# Altium footprint library Jetson-Nano-Baseboard.PcbLib: 60 footprints (part 2 of 4)
Each footprint in its own frame and in the unit in brackets; x right, y up, seen from the top. Pads: shape width x height; smd on the part's side, far side on the other; paste and mask are expansions set on the pad; w line width, h text height; cw(c..) or ccw(c..) is an arc to the next point about the centre after c.
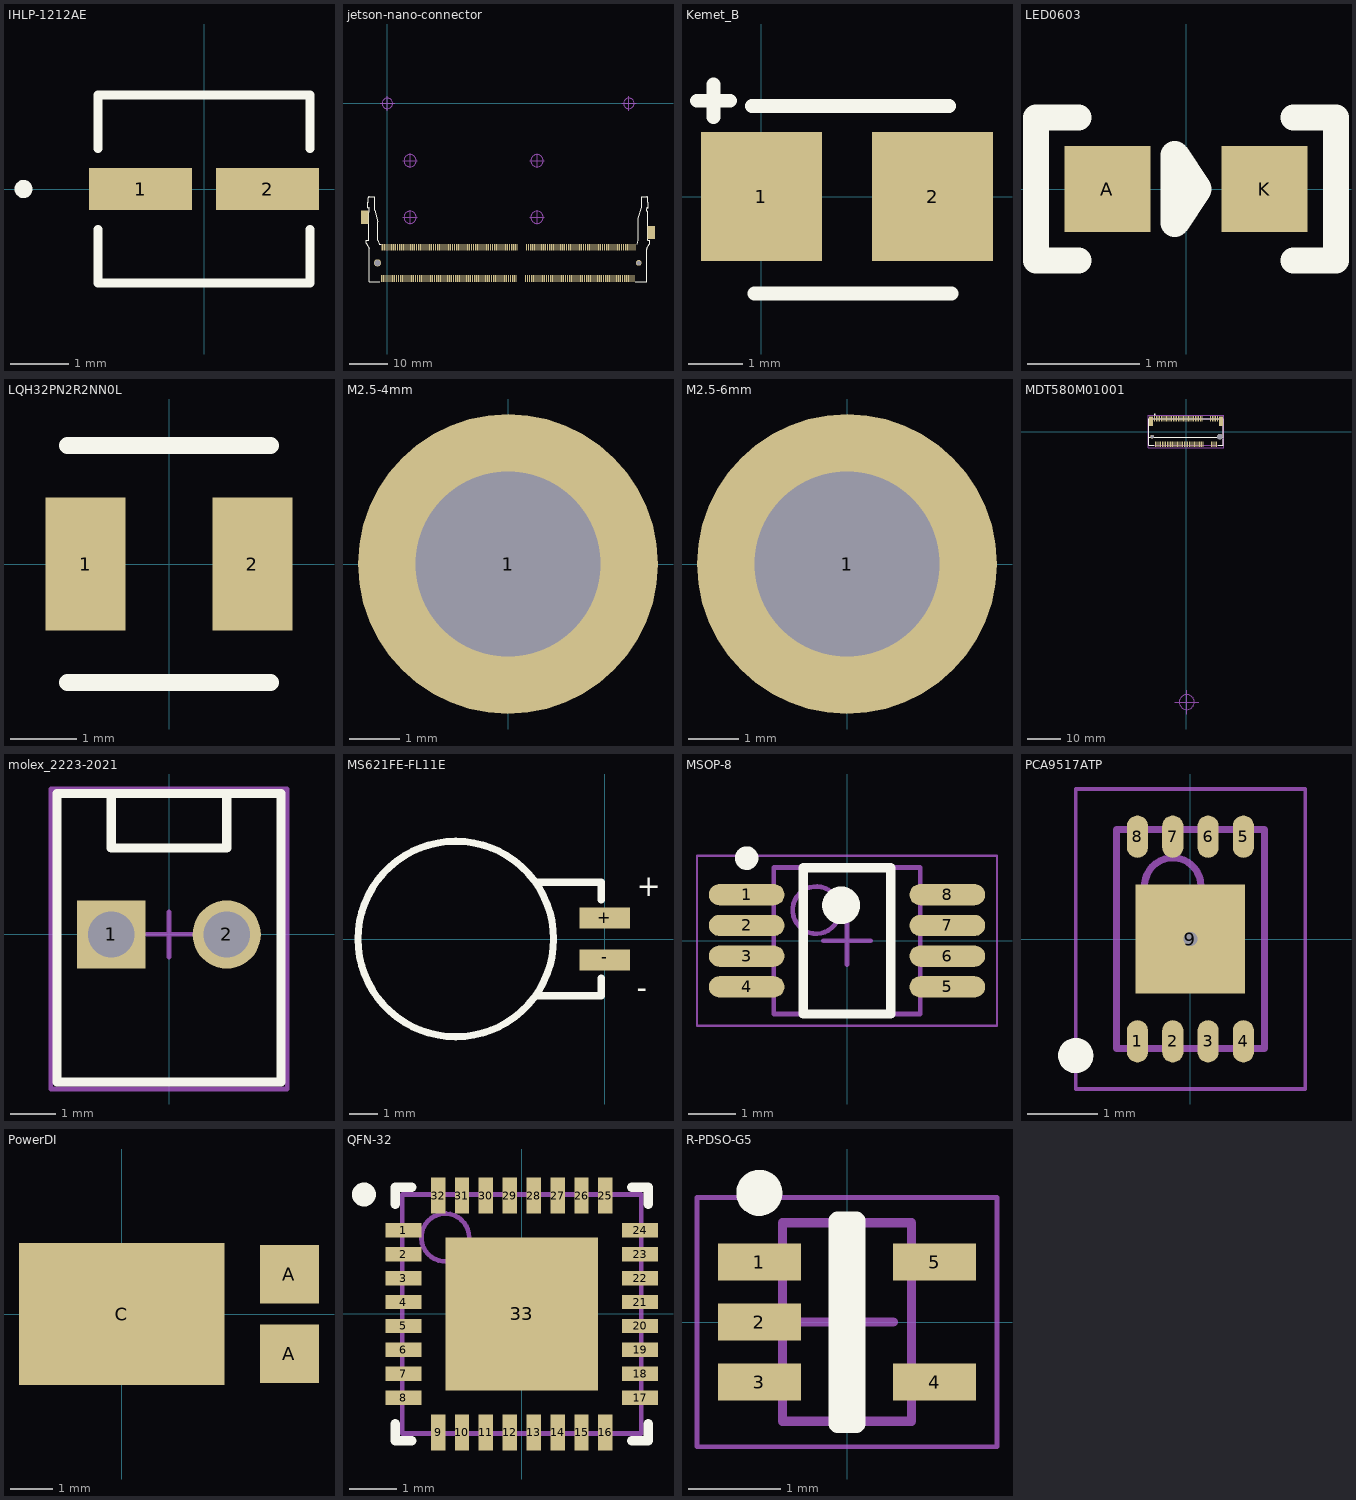
[diagram p1: the footprints below, top view; thin cyan lines are the x and y axes]

## IHLP-1212AE [mil]
pads (2):
  rect 69x28 smd: 1(-42.5,0) 2(42.5,0)
Top Overlay:
  circle w6: c-121,0 r3
  lines w6: -71,-27.1 -71,-63 71,-63 71,-27.1 ; -71,27.1 -71,63 71,63 71,27.1
3D body: height 61, standoff 0, extent -71,-63 71,63

## jetson-nano-connector [mm]
pads (264):
  rect 0.3x1.75 smd paste-0.05: 1(-1.575,-46.1) 2(-1.325,-37.9) 3(-1.075,-46.1) 4(-0.825,-37.9) 5(-0.575,-46.1) 6(-0.325,-37.9) 7(-0.075,-46.1) 8(0.175,-37.9) 9(0.425,-46.1) 10(0.675,-37.9) 11(0.925,-46.1) 12(1.175,-37.9) 13(1.425,-46.1) 14(1.675,-37.9) 15(1.925,-46.1) 16(2.175,-37.9) 17(2.425,-46.1) 18(2.675,-37.9) 19(2.925,-46.1) 20(3.175,-37.9) 21(3.425,-46.1) 22(3.675,-37.9) 23(3.925,-46.1) 24(4.175,-37.9) 25(4.425,-46.1) 26(4.675,-37.9) 27(4.925,-46.1) 28(5.175,-37.9) 29(5.425,-46.1) 30(5.675,-37.9) 31(5.925,-46.1) 32(6.175,-37.9) 33(6.425,-46.1) 34(6.675,-37.9) 35(6.925,-46.1) 36(7.175,-37.9) 37(7.425,-46.1) 38(7.675,-37.9) 39(7.925,-46.1) 40(8.175,-37.9) 41(8.425,-46.1) 42(8.675,-37.9) 43(8.925,-46.1) 44(9.175,-37.9) 45(9.425,-46.1) 46(9.675,-37.9) 47(9.925,-46.1) 48(10.175,-37.9) 49(10.425,-46.1) 50(10.675,-37.9) 51(10.925,-46.1) 52(11.175,-37.9) 53(11.425,-46.1) 54(11.675,-37.9) 55(11.925,-46.1) 56(12.175,-37.9) 57(12.425,-46.1) 58(12.675,-37.9) 59(12.925,-46.1) 60(13.175,-37.9) 61(13.425,-46.1) 62(13.675,-37.9) 63(13.925,-46.1) 64(14.175,-37.9) 65(14.425,-46.1) 66(14.675,-37.9) 67(14.925,-46.1) 68(15.175,-37.9) 69(15.425,-46.1) 70(15.675,-37.9) 71(15.925,-46.1) 72(16.175,-37.9) 73(16.425,-46.1) 74(16.675,-37.9) 75(16.925,-46.1) 76(17.175,-37.9) 77(17.425,-46.1) 78(17.675,-37.9) 79(17.925,-46.1) 80(18.175,-37.9) 81(18.425,-46.1) 82(18.675,-37.9) 83(18.925,-46.1) 84(19.175,-37.9) 85(19.425,-46.1) 86(19.675,-37.9) 87(19.925,-46.1) 88(20.175,-37.9) 89(20.425,-46.1) 90(20.675,-37.9) 91(20.925,-46.1) 92(21.175,-37.9) 93(21.425,-46.1) 94(21.675,-37.9) 95(21.925,-46.1) 96(22.175,-37.9) 97(22.425,-46.1) 98(22.675,-37.9) 99(22.925,-46.1) 100(23.175,-37.9) 101(23.425,-46.1) 102(23.675,-37.9) 103(23.925,-46.1) 104(24.175,-37.9) 105(24.425,-46.1) 106(24.675,-37.9) 107(24.925,-46.1) 108(25.175,-37.9) 109(25.425,-46.1) 110(25.675,-37.9) 111(25.925,-46.1) 112(26.175,-37.9) 113(26.425,-46.1) 114(26.675,-37.9) 115(26.925,-46.1) 116(27.175,-37.9) 117(27.425,-46.1) 118(27.675,-37.9) 119(27.925,-46.1) 120(28.175,-37.9) 121(28.425,-46.1) 122(28.675,-37.9) 123(28.925,-46.1) 124(29.175,-37.9) 125(29.425,-46.1) 126(29.675,-37.9) 127(29.925,-46.1) 128(30.175,-37.9) 129(30.425,-46.1) 130(30.675,-37.9) 131(30.925,-46.1) 132(31.175,-37.9) 133(31.425,-46.1) 134(31.675,-37.9) 135(31.925,-46.1) 136(32.175,-37.9) 137(32.425,-46.1) 138(32.675,-37.9) 139(32.925,-46.1) 140(33.175,-37.9) 141(33.425,-46.1) 142(33.675,-37.9) 143(33.925,-46.1) 144(34.175,-37.9) 145(36.425,-46.1) 146(36.675,-37.9) 147(36.925,-46.1) 148(37.175,-37.9) 149(37.425,-46.1) 150(37.675,-37.9) 151(37.925,-46.1) 152(38.175,-37.9) 153(38.425,-46.1) 154(38.675,-37.9) 155(38.925,-46.1) 156(39.175,-37.9) 157(39.425,-46.1) 158(39.675,-37.9) 159(39.925,-46.1) 160(40.175,-37.9) 161(40.425,-46.1) 162(40.675,-37.9) 163(40.925,-46.1) 164(41.175,-37.9) 165(41.425,-46.1) 166(41.675,-37.9) 167(41.925,-46.1) 168(42.175,-37.9) 169(42.425,-46.1) 170(42.675,-37.9) 171(42.925,-46.1) 172(43.175,-37.9) 173(43.425,-46.1) 174(43.675,-37.9) 175(43.925,-46.1) 176(44.175,-37.9) 177(44.425,-46.1) 178(44.675,-37.9) 179(44.925,-46.1) 180(45.175,-37.9) 181(45.425,-46.1) 182(45.675,-37.9) 183(45.925,-46.1) 184(46.175,-37.9) 185(46.425,-46.1) 186(46.675,-37.9) 187(46.925,-46.1) 188(47.175,-37.9) 189(47.425,-46.1) 190(47.675,-37.9) 191(47.925,-46.1) 192(48.175,-37.9) 193(48.425,-46.1) 194(48.675,-37.9) 195(48.925,-46.1) 196(49.175,-37.9) 197(49.425,-46.1) 198(49.675,-37.9) 199(49.925,-46.1) 200(50.175,-37.9) 201(50.425,-46.1) 202(50.675,-37.9) 203(50.925,-46.1) 204(51.175,-37.9) 205(51.425,-46.1) 206(51.675,-37.9) 207(51.925,-46.1) 208(52.175,-37.9) 209(52.425,-46.1) 210(52.675,-37.9) 211(52.925,-46.1) 212(53.175,-37.9) 213(53.425,-46.1) 214(53.675,-37.9) 215(53.925,-46.1) 216(54.175,-37.9) 217(54.425,-46.1) 218(54.675,-37.9) 219(54.925,-46.1) 220(55.175,-37.9) 221(55.425,-46.1) 222(55.675,-37.9) 223(55.925,-46.1) 224(56.175,-37.9) 225(56.425,-46.1) 226(56.675,-37.9) 227(56.925,-46.1) 228(57.175,-37.9) 229(57.425,-46.1) 230(57.675,-37.9) 231(57.925,-46.1) 232(58.175,-37.9) 233(58.425,-46.1) 234(58.675,-37.9) 235(58.925,-46.1) 236(59.175,-37.9) 237(59.425,-46.1) 238(59.675,-37.9) 239(59.925,-46.1) 240(60.175,-37.9) 241(60.425,-46.1) 242(60.675,-37.9) 243(60.925,-46.1) 244(61.175,-37.9) 245(61.425,-46.1) 246(61.675,-37.9) 247(61.925,-46.1) 248(62.175,-37.9) 249(62.425,-46.1) 250(62.675,-37.9) 251(62.925,-46.1) 252(63.175,-37.9) 253(63.425,-46.1) 254(63.675,-37.9) 255(63.925,-46.1) 256(64.175,-37.9) 257(64.425,-46.1) 258(64.675,-37.9) 259(64.925,-46.1) 260(65.175,-37.9)
  rect 2x3.5 smd paste-0.05: 261(69.525,-34) 262(-5.975,-30)
  round 1.9 hole 1.6 unplated: M(-2.6,-42)
  round 1.5 hole 1.1 unplated: M(66.2,-42)
Top Overlay:
  lines w0.1: -4.954,-28.6 -4.954,-36 -5.5,-36.05 ; -4.878,-28.6 ccw(c-4.878,-28.45) -4.728,-28.45 -4.728,-27.667 ccw(c-4.878,-27.667) -4.878,-27.517 -5.127,-27.517 -5.127,-26.028 -4.978,-26.028 -4.978,-24.813 cw(c-4.778,-24.813) -4.778,-24.613 -3.871,-24.613 -3.871,-24.61 -3.371,-24.61 -3.371,-28.128 -2.5,-31.166 -2.5,-36.05 -2.15,-37.15 -1.65,-37.15 ; 65.85,-37.15 66.1,-36.05 ; -5.5,-36.813 ccw(c-5,-36.813) -5.43,-37.068 ; -5.5,-36.813 ccw(c-5,-36.813) -5.43,-37.068 ; -5.5,-36.813 -5.5,-36.05 ; -5.5,-36.813 -5.5,-36.05 ; -5.43,-37.068 -4.77,-38.182 ; -5.43,-37.068 -4.77,-38.182 ; -4.77,-38.182 cw(c-5.2,-38.437) -4.7,-38.437 ; -4.77,-38.182 cw(c-5.2,-38.437) -4.7,-38.437 ; -4.7,-47 -1.95,-47 -4.7,-47 ; -4.7,-47 -4.7,-38.437 ; -4.7,-47 -4.7,-38.437 ; 66.1,-36.05 66.1,-30.318 ; 66.1,-36.05 66.1,-30.318 ; 66.1,-30.318 66.98,-27.318 66.98,-24.595 67.59,-24.595 ccw(c67.63,-24.45) 67.63,-24.6 68.35,-24.6 cw(c68.35,-24.8) 68.55,-24.8 68.55,-26 68.736,-26 68.736,-27.5 68.5,-27.5 ccw(c68.5,-27.7) 68.3,-27.7 68.3,-28.3 ccw(c68.5,-28.3) 68.5,-28.5 68.545,-28.5 68.545,-36 69.1,-36.05 ; 68.3,-47 65.3,-47 68.3,-47 ; 68.3,-47 68.3,-38.437 ; 68.3,-47 68.3,-38.437 ; 68.3,-38.437 cw(c68.8,-38.437) 68.37,-38.182 ; 68.3,-38.437 cw(c68.8,-38.437) 68.37,-38.182 ; 68.37,-38.182 69.03,-37.068 ; 68.37,-38.182 69.03,-37.068 ; 69.03,-37.068 ccw(c68.6,-36.813) 69.1,-36.813 ; 69.03,-37.068 ccw(c68.6,-36.813) 69.1,-36.813 ; 69.1,-36.813 69.1,-36.05 ; 69.1,-36.813 69.1,-36.05
Mechanical 3:
  circle w0.1: c63.6,0 r1.375
  circle w0.1: c39.413,-30.002 r1.6
  circle w0.1: c39.413,-15.098 r1.6
  circle w0.1: c5.987,-15.098 r1.6
  circle w0.1: c5.987,-30.002 r1.6
  circle w0.1: c0,0 r1.375
  lines w0.1: -1.9,0 0,0 ; 0,-1.9 0,0 ; 0,1.9 0,0 ; 1.9,0 0,0 ; 4.094,-29.997 5.994,-29.997 ; 4.094,-15.088 5.994,-15.088 ; 5.994,-31.897 5.994,-29.997 ; 5.994,-28.097 5.994,-29.997 ; 5.994,-16.988 5.994,-15.088 ; 5.994,-13.188 5.994,-15.088 ; 7.894,-29.997 5.994,-29.997 ; 7.894,-15.088 5.994,-15.088 ; 37.521,-29.997 39.421,-29.997 ; 37.521,-15.113 39.421,-15.113 ; 39.421,-31.897 39.421,-29.997 ; 39.421,-28.097 39.421,-29.997 ; 39.421,-17.013 39.421,-15.113 ; 39.421,-13.213 39.421,-15.113 ; 41.321,-29.997 39.421,-29.997 ; 41.321,-15.113 39.421,-15.113 ; 61.702,0 63.602,0 ; 63.602,-1.9 63.602,0 ; 63.602,1.9 63.602,0 ; 65.502,0 63.602,0
  text "its real position may differ" at 21.15,-1.2 h0.76
  text "module mounting holes placement taken from 3D models" at 12.125,-0.125 h0.76
3D body: height 9.23, standoff -0.42, extent -6.275,-46.9 69.824,-21.05

## jetson-nano-module [mm]
height 13.55
3D body: height 10.73, standoff 5.48, extent -3,-42 66.6,3

## Kemet_B [mm] "Kemet B size package. Low desity level"
height 1.9
pads (2):
  rect 2.21x2.35 smd: 1(0,0) 2(3.13,0)
Top Overlay:
  lines w0.254: -1.175,1.75 -0.575,1.75 ; -0.875,1.45 -0.875,2.05 ; -0.175,1.65 3.425,1.65 ; -0.125,-1.775 3.475,-1.775
3D body: height 2.11, standoff 0.01, extent -0.225,-1.575 3.475,1.425

## LED0603 [mil]
pads (2):
  rect 30x30 smd: A(-27.5,0) K(27.5,0)
Top Overlay:
  lines w9: -37.5,-25 -52.5,-25 -52.5,25 -37.5,25 ; 37.5,-25 52.5,-25 52.5,25 37.5,25
  lines w10: -3.88,-11.81 4,0 -3.88,11.81 -3.88,-11.81
3D body: height 43.31, standoff 0, extent -32.82,-15.75 30.97,15.75

## LQH32PN2R2NN0L [mm]
height 1.4
pads (2):
  rect 1.2x2 smd: 1(-1.25,0) 2(1.25,0)
Top Overlay:
  lines w0.254: -1.524,-1.778 1.524,-1.778 ; -1.524,1.778 1.524,1.778
3D body: height 1.4, standoff 0.1, extent -1.524,-1.524 1.524,1.651

## M2.5-4mm [mm] "SMT Steel Spacer, M2.5 Thread Internal, 4mm"
height 6
pads (1):
  round 6 / inner round 0 / far side round 0 hole 3.7 paste-403.566: 1(0,0)
Top Paste:
  drawing of 4 lines, arcs and shapes, not listed
Mechanical 13:
  circle w0.12: c0,0 r2.55
3D body: height 4, standoff -1.4, extent -2.55,-2.545 2.53,2.545

## M2.5-6mm [mm] "SMT Steel Spacer, M2.5 Thread Internal, 6mm"
height 6
pads (1):
  round 6 / inner round 0 / far side round 0 hole 3.7 paste-403.566: 1(0,0)
Top Paste:
  drawing of 4 lines, arcs and shapes, not listed
Mechanical 13:
  circle w0.12: c0,0 r2.55
3D body: height 6, standoff -1.4, extent -2.55,-2.545 2.53,2.545

## MDT580M01001 [mm]
pads (71):
  rect 0.3x1.55 smd: 1(-9.25,3.775) 2(-9,-3.775) 3(-8.75,3.775) 4(-8.5,-3.775) 5(-8.25,3.775) 6(-8,-3.775) 7(-7.75,3.775) 8(-7.5,-3.775) 9(-7.25,3.775) 10(-7,-3.775) 11(-6.75,3.775) 12(-6.5,-3.775) 13(-6.25,3.775) 14(-6,-3.775) 15(-5.75,3.775) 16(-5.5,-3.775) 17(-5.25,3.775) 18(-5,-3.775) 19(-4.75,3.775) 20(-4.5,-3.775) 21(-4.25,3.775) 22(-4,-3.775) 23(-3.75,3.775) 24(-3.5,-3.775) 25(-3.25,3.775) 26(-3,-3.775) 27(-2.75,3.775) 28(-2.5,-3.775) 29(-2.25,3.775) 30(-2,-3.775) 31(-1.75,3.775) 32(-1.5,-3.775) 33(-1.25,3.775) 34(-1,-3.775) 35(-0.75,3.775) 36(-0.5,-3.775) 37(-0.25,3.775) 38(0,-3.775) 39(0.25,3.775) 40(0.5,-3.775) 41(0.75,3.775) 42(1,-3.775) 43(1.25,3.775) 44(1.5,-3.775) 45(1.75,3.775) 46(2,-3.775) 47(2.25,3.775) 48(2.5,-3.775) 49(2.75,3.775) 50(3,-3.775) 51(3.25,3.775) 52(3.5,-3.775) 53(3.75,3.775) 54(4,-3.775) 55(4.25,3.775) 56(4.5,-3.775) 57(4.75,3.775) 58(5,-3.775) 67(7.25,3.775) 68(7.5,-3.775) 69(7.75,3.775) 70(8,-3.775) 71(8.25,3.775) 72(8.5,-3.775) 73(8.75,3.775) 74(9,-3.775) 75(9.25,3.775)
  round 1.1 hole 1.1 unplated: None(-10,-1.5)
  round 1.6 hole 1.6 unplated: None(10,-1.5)
  rect 1.2x2.75 smd: SH1(-10.35,3) SH2(10.35,3)
Top Overlay:
  circle w0.2: c-9.225,5.075 r0.1
  lines w0.1: -10.95,-4 -10.95,-1.75 -8.76,-1.75
  lines w0.127: -10.95,1 -10.95,-4 -9.5,-4 ; -10.575,3.75 -6.175,3.75 ; -6.075,3.75 10.575,3.75 10.95,3.75 ; 6.075,-1.75 -10.575,-1.75 -10.95,-1.75 ; 6.175,-1.75 10.575,-1.75 10.95,-1.75 ; 9.5,-4 10.95,-4 10.95,-2.1 ; 10.95,-0.9 10.95,1 ; -10.95,-1.75 -10.95,3.75 ; -10.95,-1.75 -10.95,3.75 ; -10.95,3.75 10.95,3.75 ; 10.95,-1.75 10.95,3.75 ; 10.95,-1.75 10.95,3.75
Mechanical 3:
  circle w0.2: c0.223,-79.843 r2.209
  lines w0.2: -3.298,-79.843 0.223,-79.843 ; 0.223,-83.364 0.223,-79.843 ; 0.223,-76.323 0.223,-79.843 ; 3.743,-79.843 0.223,-79.843
Mechanical 4:
  circle w0.2: c-9.25,4.115 r0.1
  circle w0.2: c-9.25,4.115 r0.1
  lines w0.127: -10.95,-4 -10.95,3.75 ; -10.95,-4 10.95,-4 ; -10.95,-4 -10.95,3.75 ; -10.95,-4 10.95,-4 ; -10.95,3.75 10.95,3.75 ; -10.95,3.75 10.95,3.75 ; 10.95,-4 10.95,3.75 ; 10.95,-4 10.95,3.75
Mechanical 16:
  lines w0.05: -11.2,-4.8 -11.2,4.8 11.2,4.8 11.2,-4.8 -11.2,-4.8
3D body: height 5.95, standoff -0.6, extent -10.99,-4.27 11.01,4.28

## molex_2223-2021 [mm] "Pinhead male 1x2 pitch 2.54mm straight"
pads (2):
  rect 1.5x1.5 hole 1.02: 1(-1.27,0)
  round 1.5 hole 1.02: 2(1.27,0)
Top Overlay:
  lines w0.2: -1.27,3.1 -1.27,1.905 1.27,1.905 1.27,3.1 ; -2.465,-3.25 2.465,-3.25 2.465,3.1 -2.465,3.1 -2.465,-3.25
Mechanical 13:
  lines w0.1: -1.27,3.1 -1.27,1.905 1.27,1.905 1.27,3.1 ; -2.465,-3.25 2.465,-3.25 2.465,3.1 -2.465,3.1 -2.465,-3.25
Mechanical 15:
  lines w0.1: -0.5,0 0.5,0 ; 0,-0.5 0,0.5 ; -2.6,-3.4 -2.6,3.2 2.6,3.2 2.6,-3.4 -2.6,-3.4
3D body: height 10.68, standoff -3.54, extent -2.489,-3.2 2.439,3.15

## MS621FE-FL11E [mm]
pads (2):
  rect 1.8x0.75 smd: +(0,0.75) -(0,-0.75)
Top Overlay:
  circle w0.254: c-5.334,0 r3.5
  lines w0.254: -2.413,-2.032 -0.127,-2.032 -0.127,-1.397 ; -2.413,2.032 -0.127,2.032 -0.127,1.397
  text "-" at 1.143,-1.524 h0.76
  text "+" at 1.143,1.524 h0.76
3D body: height 2.69, standoff -0.01, extent -8.714,-3.429 0.586,3.371

## MSOP-8 [mm]
height 1.1
pads (8):
  oval 1.6x0.45 smd: 1(-2.125,0.975) 2(-2.125,0.325) 3(-2.125,-0.325) 4(-2.125,-0.975) 5(2.125,-0.975) 6(2.125,-0.325) 7(2.125,0.325) 8(2.125,0.975)
Top Overlay:
  circle w0.25: c-2.125,1.75 r0.125
  circle w0.4: c-0.125,0.75 r0.2
  lines w0.2: -0.925,-1.55 -0.925,1.55 0.925,1.55 0.925,-1.55 -0.925,-1.55
Mechanical 13:
  circle w0.1: c-0.65,0.65 r0.5
  lines w0.1: -1.55,-1.55 -1.55,1.55 1.55,1.55 1.55,-1.55 -1.55,-1.55
Mechanical 15:
  lines w0.05: -3.175,-1.8 -3.175,1.8 3.175,1.8 3.175,-1.8 -3.175,-1.8
  lines w0.1: -0.5,0 0.5,0 ; 0,-0.5 0,0.5
3D body: height 1.15, standoff 0, extent -2.45,-1.524 2.45,1.476

## PCA9517ATP [mm]
height 0.75
pads (9):
  oval 0.3x0.6 smd: 1(-0.75,-1.45) 2(-0.25,-1.45) 3(0.25,-1.45) 4(0.75,-1.45) 5(0.75,1.45) 6(0.25,1.45) 7(-0.25,1.45) 8(-0.75,1.45)
  rect 1.55x1.55 smd: 9(0,0)
via 0,0 diameter 0.5 hole 0.2
Top Overlay:
  circle w0.25: c-1.625,-1.651 r0.125
Mechanical 13:
  circle w0.1: c-0.25,0.75 r0.4
  lines w0.1: -1.05,-1.55 -1.05,1.55 1.05,1.55 1.05,-1.55 -1.05,-1.55
Mechanical 15:
  lines w0.05: -1.625,-2.125 -1.625,2.125 1.625,2.125 1.625,-2.125 -1.625,-2.125
  lines w0.1: -0.5,0 0.5,0 ; 0,-0.5 0,0.5
3D body: height 0.75, standoff 0.02, extent -1.05,-1.55 1.05,1.55

## PowerDI [mm]
pads (3):
  rect 1.4x1.39 smd: A(3.962,-0.94) A(3.962,0.94)
  rect 4.86x3.36 smd: C(0,0)
3D body: height 1.17, standoff 0.02, extent -2.208,-2.083 4.392,1.967

## QFN-32 [mm] "QFN, 32-Leads, Body 5,00x5,00mm, Pitch 0,50mm, Thermal Pad 3,20x3,20mm, IPC Medium Density"
height 1
pads (33):
  rect 0.75x0.3 smd: 1(-2.475,1.75) 2(-2.475,1.25) 3(-2.475,0.75) 4(-2.475,0.25) 5(-2.475,-0.25) 6(-2.475,-0.75) 7(-2.475,-1.25) 8(-2.475,-1.75) 17(2.475,-1.75) 18(2.475,-1.25) 19(2.475,-0.75) 20(2.475,-0.25) 21(2.475,0.25) 22(2.475,0.75) 23(2.475,1.25) 24(2.475,1.75)
  rect 0.3x0.75 smd: 9(-1.75,-2.475) 10(-1.25,-2.475) 11(-0.75,-2.475) 12(-0.25,-2.475) 13(0.25,-2.475) 14(0.75,-2.475) 15(1.25,-2.475) 16(1.75,-2.475) 25(1.75,2.475) 26(1.25,2.475) 27(0.75,2.475) 28(0.25,2.475) 29(-0.25,2.475) 30(-0.75,2.475) 31(-1.25,2.475) 32(-1.75,2.475)
  rect 3.2x3.2 smd: 33(0,0)
Top Overlay:
  circle w0.25: c-3.3,2.5 r0.125
  lines w0.2: -2.65,-2.3 -2.65,-2.65 -2.3,-2.65 ; -2.65,2.3 -2.65,2.65 -2.3,2.65 ; 2.3,-2.65 2.65,-2.65 2.65,-2.3 ; 2.3,2.65 2.65,2.65 2.65,2.3
Mechanical 13:
  circle w0.1: c-1.6,1.6 r0.5
  lines w0.1: -2.5,-2.5 -2.5,2.5 2.5,2.5 2.5,-2.5 -2.5,-2.5
3D body: height 1, standoff 0.05, extent -2.5,-2.5 2.5,2.5
3D body: height 0.25, standoff 0, extent -2.5,-2.5 2.5,2.5

## R-PDSO-G5 [mm] "SOT23, 5-Leads, Body 2.00x2.10mm, Pitch 0.65mm, IPC Medium Density"
height 1.1
pads (5):
  rect 0.9x0.4 smd: 1(-0.95,0.65) 2(-0.95,0) 3(-0.95,-0.65) 4(0.95,-0.65) 5(0.95,0.65)
Top Overlay:
  circle w0.25: c-0.95,1.4 r0.125
  lines w0.2: -0.1,-1.1 0.1,-1.1 0.1,1.1 -0.1,1.1 -0.1,-1.1
Mechanical 13:
  lines w0.1: -0.7,-1.075 -0.7,1.075 0.7,1.075 0.7,-1.075 -0.7,-1.075
Mechanical 15:
  lines w0.05: -1.625,-1.35 -1.625,1.35 1.625,1.35 1.625,-1.35 -1.625,-1.35
  lines w0.1: -0.5,0 0.5,0 ; 0,-0.5 0,0.5
3D body: height 1.1, standoff 0, extent -0.7,-1.075 0.7,1.075